# Altium schematic symbol library LATTICEPLDS_Library.SchLib: 291 symbols (part 12 of 32) (continued)
## LFE3-17EA/35EA-FN256 (continued)
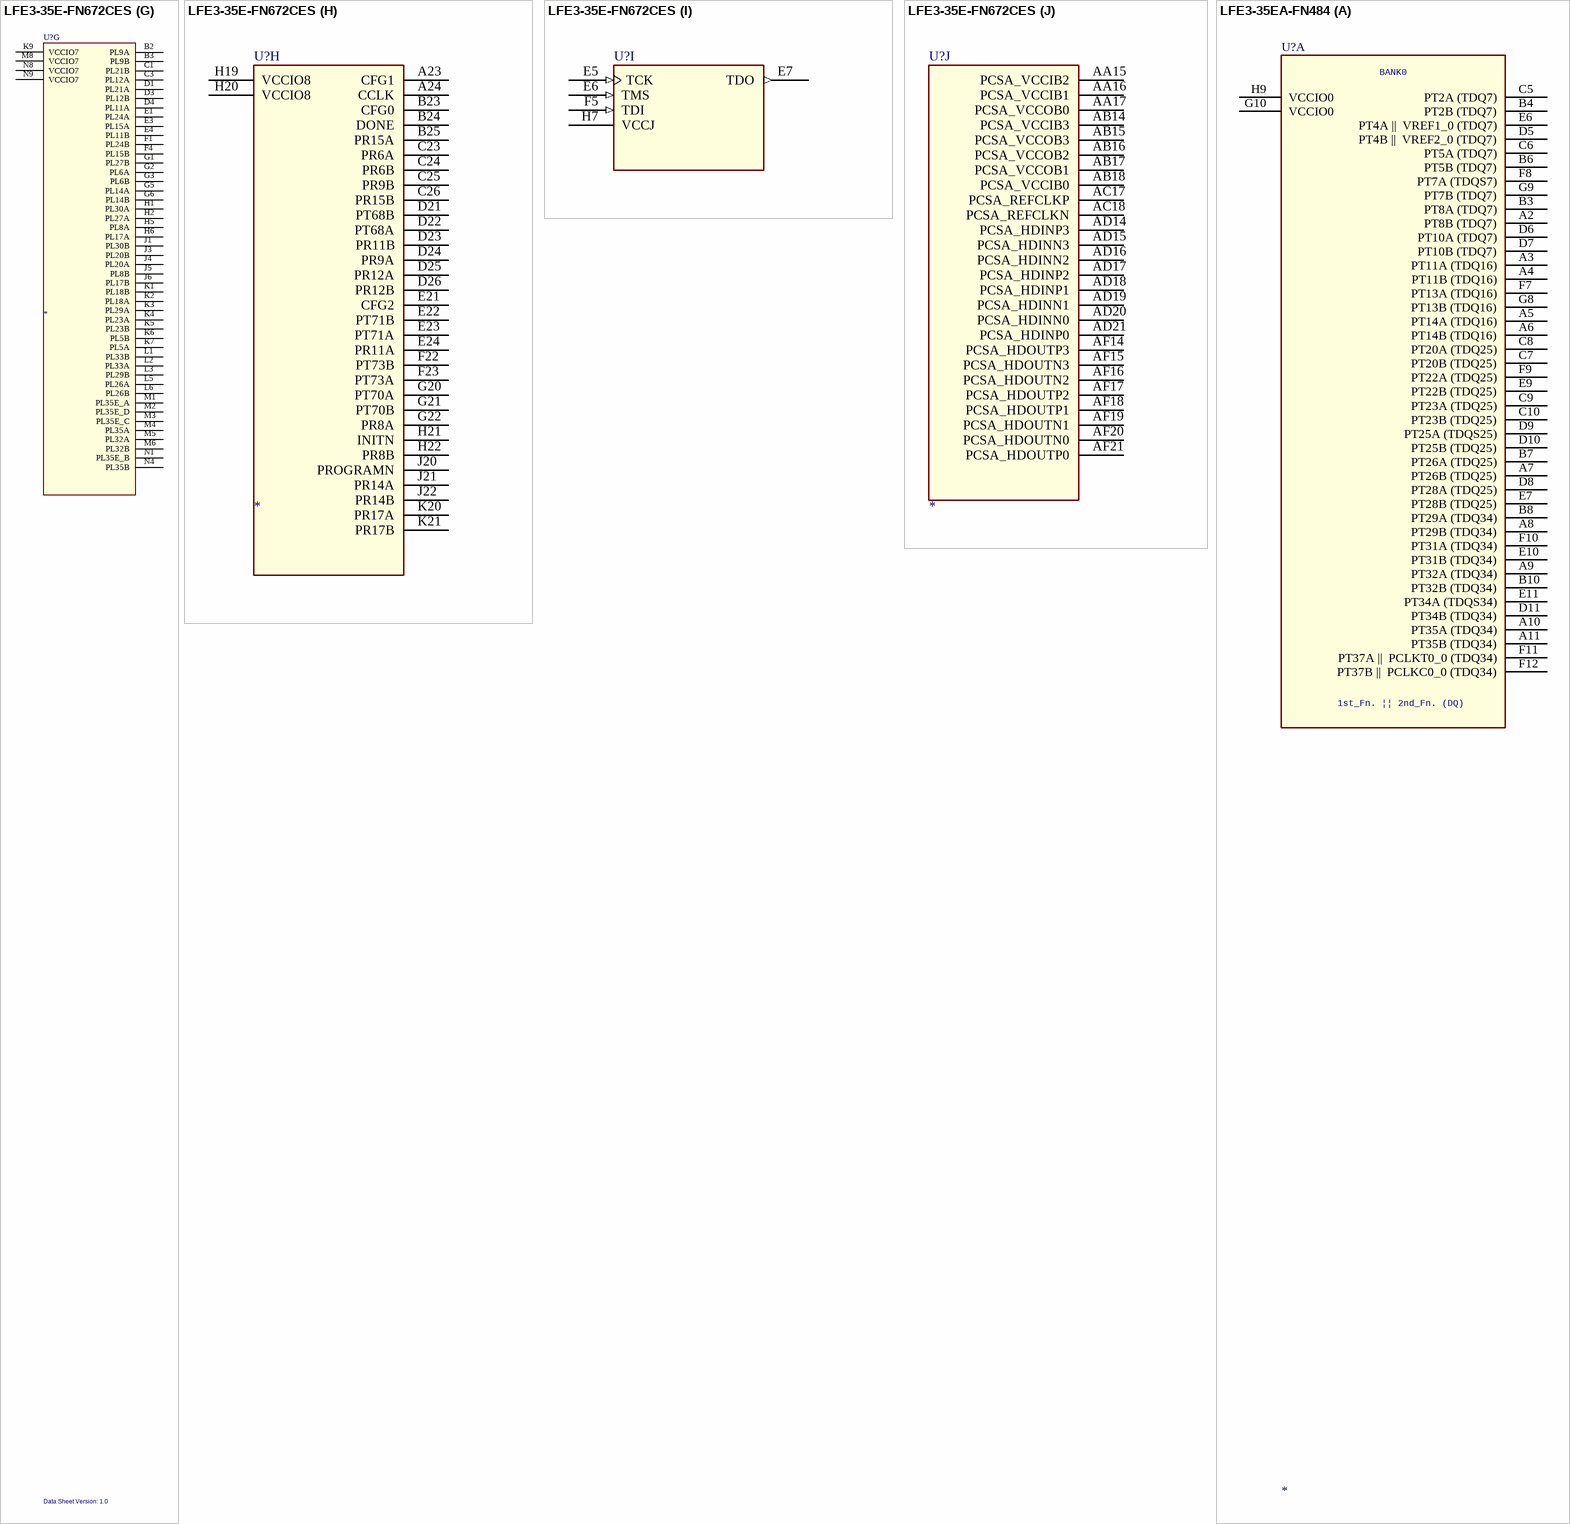
[diagram p129: symbols LFE3-35E-FN672CES to LFE3-35EA-FN484]
part A text: ^DQS; *True LVDS
part B text: ^DQS; *True LVDS
part E text: ^DQS; *True LVDS
part F text: ^DQS; *True LVDS
part H text: ^DQS; *True LVDS
part I text: ^DQS; *True LVDS

## LFE3-35E-FN672CES
designator U?  Data Sheet Version: 1.0
SPLIT_INST: TRUE; SWAP_INFO: (S1+S2+S3+S4+S5+S6+S7+S8+S9+S10)
part A pins: A2 GND (power), A8 NC, A25 GND (power), AA6 GND (power), AA8 GND (power), AA9 GND (power), AA10 NC, AA11 NC, AA12 NC, AA13 GND (power), AA14 GND (power), AA18 GND (power), AA19 GND (power), AA21 GND (power), AB2 GND (power), AB8 GND (power), AB9 NC, AB10 NC, AB11 NC, AB12 NC, AB13 NC, AB19 GND (power), AB25 GND (power), AC5 GND (power), AC6 GND (power), AC7 GND (power), AC8 GND (power), AC9 NC, AC10 NC, AC11 GND (power), AC12 GND (power), AC13 GND (power), AC14 GND (power), AC15 GND (power), AC16 GND (power), AC19 GND (power), AC20 GND (power), AC21 GND (power), AC22 GND (power), AD5 GND (power), AD6 NC, AD7 NC, AD8 NC, AD9 NC, AD10 NC, AD11 NC, AD12 NC, AD13 NC, AD22 GND (power), AE1 GND (power), AE5 GND (power), AE6 GND (power), AE7 GND (power), AE8 GND (power), AE9 GND (power), AE10 GND (power), AE11 GND (power), AE12 GND (power), AE13 GND (power), AE14 GND (power), AE15 GND (power), AE16 GND (power), AE17 GND (power), AE18 GND (power), AE19 GND (power), AE20 GND (power), AE21 GND (power), AE22 GND (power), AE26 GND (power), AF2 GND (power), AF5 GND (power), AF6 NC, AF7 NC, AF8 NC, AF9 NC, AF10 NC, AF11 NC, AF12 NC, AF13 NC, AF22 GND (power), AF25 GND (power), B1 GND (power), B5 GND (power), B8 NC, B9 GND (power), B14 GND (power), B18 GND (power), B22 GND (power), B26 GND (power), C2 NC, C9 NC, C10 NC, C18 NC, C19 NC, D2 NC, D7 GND (power), D9 NC, D10 NC, D11 GND (power), D16 GND (power), D18 NC, D19 NC, D20 GND (power), E2 GND (power), E10 NC, E17 NC, E25 GND (power), E26 NC, F2 NC, F3 NC, F6 GND (power), F10 NC, F16 NC, F17 NC, F18 NC, F21 GND (power), F24 NC, F25 NC, F26 NC, G4 GND (power), G9 NC, G10 NC, G12 GND (power), G15 GND (power), G16 NC, G17 NC, G23 GND (power), G24 NC, G26 NC, H3 NC, H4 NC, H9 GND (power), H10 NC, H11 NC, H16 NC, H17 NC, H18 GND (power), H23 NC, H25 NC, H26 NC, J2 GND (power), J7 NC, J8 GND (power), J9 VCCAUX, J11 VCCAUX, J12 GND (power), J15 GND (power), J16 VCCAUX, J18 VCCAUX, J19 GND (power), J23 NC, J25 GND (power), K8 NC, K10 GND (power), K11 VCC, K12 VCC, K13 VCC, K14 VCC, K15 VCC, K16 VCC, K17 GND (power), K22 NC, K23 NC, L4 GND (power), L7 NC, L8 NC, L9 VCCAUX, L10 VCC, L11 VCC, L12 VCC, L13 GND (power), L14 GND (power), L15 VCC, L16 VCC, L17 VCC, L18 VCCAUX, L21 NC, L22 NC, L23 GND (power), M7 GND (power), M9 GND (power), M10 VCCPLL_L, M11 VCC, M12 GND (power), M13 GND (power), M14 GND (power), M15 GND (power), M16 VCC, M17 VCCPLL_R, M18 GND (power), M20 GND (power), N2 GND (power), N7 VTT7 (power), N10 VCC, N11 GND (power), N12 GND (power), N13 GND (power), N14 GND (power), N15 GND (power), N16 GND (power), N17 VCC, N20 VTT2 (power), P7 VTT6 (power), P10 VCC, P11 GND (power), P12 GND (power), P13 GND (power), P14 GND (power), P15 GND (power), P16 GND (power), P17 VCC, P20 VTT3 (power), P25 GND (power), R7 GND (power), R9 GND (power), R10 VCCPLL_L, R11 VCC, R12 GND (power), R13 GND (power), R14 GND (power), R15 GND (power), R16 VCC, R17 VCCPLL_R, R18 XRES, R20 GND (power), T4 GND (power), T5 NC, T6 NC, T9 VCCAUX, T10 VCC, T11 VCC, T12 VCC, T13 GND (power), T14 GND (power), T15 VCC, T16 VCC, T17 VCC, T18 VCCAUX, T19 GND (power), T23 GND (power), U5 NC, U6 NC, U7 NC, U8 NC, U10 RESERVED, U11 VCC, U12 VCC, U13 VCC, U14 VCC, U15 VCC, U16 VCC, U17 GND (power), V2 GND (power), V3 NC, V4 NC, V8 RESERVED, V9 VCCAUX, V11 VCCAUX, V12 GND (power), V13 VCCA, V14 VCCA, V15 GND (power), V16 VCCAUX, V17 NC, V18 VCCAUX, V19 GND (power), V23 NC, V25 GND (power), W3 NC, W4 NC, W5 NC, W11 GND (power), W12 VCCA, W13 VCCA, W14 VCCA, W15 VCCA, W16 GND (power), W18 NC, W24 NC, W25 NC, W26 NC, Y1 NC, Y2 NC, Y3 NC, Y4 GND (power), Y9 GND (power), Y10 GND (power), Y11 GND (power), Y12 GND (power), Y13 VCCA, Y14 VCCA, Y15 GND (power), Y16 GND (power), Y17 GND (power), Y18 GND (power), Y23 GND (power), Y25 NC, Y26 NC
part B pins: A3 PT11A, A4 PT11B, A5 PT17A, A6 PT17B, A7 PT14B, A9 PT20A, A10 PT23A, A11 PT23B, A12 PT29A, A13 PT32A, A14 PT32B, A15 PT35A, A16 PT35B, B4 PT7B, B6 PT2A, B7 PT14A, B10 PT20B, B11 PT26A, B12 PT26B, B13 PT29B, C4 PT4B, C5 PT7A, C6 PT5B, C7 PT2B, C8 PT8B, C11 PT25B, C12 PT31A, C13 PT31B, D5 PT4A, D6 PT5A, D8 PT8A, D12 PT25A, D13 PT37B, E8 PT16A, E9 PT16B, E11 PT28A, E12 PT28B, E13 PT37A, F7 PT13A, F8 PT13B, F9 PT19B, F11 PT22A, F12 PT34A, G7 PT10A, G8 PT19A, G11 PT22B, G13 PT34B, H8 PT10B, H12 VCCIO0 (power), H13 VCCIO0 (power), J10 VCCIO0 (power), J13 VCCIO0 (power)
part C pins: A17 PT44A, A18 PT44B, A19 PT47A, A20 PT47B, A21 PT50A, A22 PT59B, B15 PT38B, B16 PT41A, B17 PT46A, B19 PT53B, B20 PT50B, B21 PT59A, C14 PT40A, C15 PT38A, C16 PT41B, C17 PT46B, C20 PT53A, C21 PT62B, C22 PT62A, D14 PT40B, D15 PT55A, D17 PT58B, E14 PT49A, E15 PT49B, E16 PT55B, E18 PT58A, E19 PT56A, E20 PT56B, F13 PT43A, F14 PT43B, F15 PT52B, F19 PT61A, F20 PT61B, G14 PT52A, G18 PT64A, G19 PT64B, H14 VCCIO1 (power), H15 VCCIO1 (power), J14 VCCIO1 (power), J17 VCCIO1 (power)
part D pins: G25 PR18B, H24 PR18A, J24 PR21B, J26 PR27A, K18 VCCIO2 (power), K19 PR30A, K24 PR21A, K25 PR24B, K26 PR27B, L19 PR30B, L20 PR20A, L24 PR24A, L25 PR33A, L26 PR33B, M19 VCCIO2 (power), M21 PR20B, M22 PR26A, M23 PR23A, M24 PR23B, M25 PR35E_A, M26 PR35E_B, N18 VCCIO2 (power), N19 VCCIO2 (power), N21 PR26B, N22 PR29B, N23 PR29A, P21 PR35A, P22 PR35B, P23 PR32A, R21 PR35E_D, R22 PR32B, T21 PR35E_C
part E pins: AA20 PB73B, AA22 PR68B, AA23 PR62B, AA24 PR62A, AA25 PR54A, AA26 PR57A, AB20 PB67A, AB21 PB67B, AB22 PB71B, AB23 PB71A, AB24 PR66A, AB26 PR57B, AC23 PB65B, AC24 PR66B, AC25 PR63B, AC26 PR63A, AD23 PB65A, AD24 PR71A, AD25 PR60B, AD26 PR60A, AE23 PB68B, AE24 PR71B, AE25 PR69A, AF23 PB68A, AF24 PR69B, N24 PR36A, N25 PR36B, N26 PR42A, P18 VCCIO3 (power), P19 VCCIO3 (power), P24 PR39A, P26 PR42B, R19 VCCIO3 (power), R23 PR41A, R24 PR39B, R25 PR45A, R26 PR45B, T20 PR44A, T22 PR41B, T24 PR48B, T25 PR48A, T26 PR51A, U18 VCCIO3 (power), U19 PR38B, U20 PR38A, U21 PR44B, U22 PR53B, U23 PR53A, U24 PR47A, U25 PR53E_A, U26 PR51B, V20 PR53E_C, V21 PR50A, V22 PR50B, V24 PR47B, V26 PR53E_B, W17 PB70A, W19 PR53E_D, W20 PR59B, W21 PR59A, W22 PR56B, W23 PR56A, Y19 PR65A, Y20 PR65B, Y21 PB73A, Y22 PR68A, Y24 PR54B
part F pins: AA1 PL54A, AA2 PL54B, AA3 PL63A, AA4 PL63B, AA5 PL62B, AA7 PB4A, AB1 PL57A, AB3 PL66A, AB4 PL66B, AB5 PL65A, AB6 PL65B, AB7 PB4B, AC1 PL57B, AC2 PL60A, AC3 PL60B, AC4 PB5B, AD1 PL69A, AD2 PL69B, AD3 PB5A, AD4 PB2A, AE2 PB8A, AE3 PB2B, AE4 PB11A, AF3 PB8B, AF4 PB11B, N3 PL41A, N5 PL38A, N6 PL38B, P1 PL36A, P2 PL36B, P3 PL41B, P4 PL45A, P5 PL44A, P6 PL44B, P8 VCCIO6 (power), P9 VCCIO6 (power), R1 PL39A, R2 PL39B, R3 PL45B, R4 PL50B, R5 PL47A, R6 PL47B, R8 VCCIO6 (power), T1 PL48A, T2 PL42A, T3 PL50A, T7 PL53A, T8 PL53B, U1 PL48B, U2 PL51B, U3 PL42B, U4 PL53E_C, U9 VCCIO6 (power), V1 PL51A, V5 PL53E_D, V6 PL56A, V7 PL56B, V10 PB13A, W1 PL53E_A, W2 PL53E_B, W6 PL59B, W7 PL59A, W8 PL71A, W9 PL71B, W10 PB13B, Y5 PL62A, Y6 PL68A, Y7 PL68B, Y8 PB10A
part G pins: B2 PL9A, B3 PL9B, C1 PL21B, C3 PL12A, D1 PL21A, D3 PL12B, D4 PL11A, E1 PL24A, E3 PL15A, E4 PL11B, F1 PL24B, F4 PL15B, G1 PL27B, G2 PL6A, G3 PL6B, G5 PL14A, G6 PL14B, H1 PL30A, H2 PL27A, H5 PL8A, H6 PL17A, J1 PL30B, J3 PL20B, J4 PL20A, J5 PL8B, J6 PL17B, K1 PL18B, K2 PL18A, K3 PL29A, K4 PL23A, K5 PL23B, K6 PL5B, K7 PL5A, K9 VCCIO7 (power), L1 PL33B, L2 PL33A, L3 PL29B, L5 PL26A, L6 PL26B, M1 PL35E_A, M2 PL35E_D, M3 PL35E_C, M4 PL35A, M5 PL32A, M6 PL32B, M8 VCCIO7 (power), N1 PL35E_B, N4 PL35B, N8 VCCIO7 (power), N9 VCCIO7 (power)
part H pins: A23 CFG1, A24 CCLK, B23 CFG0, B24 DONE, B25 PR15A, C23 PR6A, C24 PR6B, C25 PR9B, C26 PR15B, D21 PT68B, D22 PT68A, D23 PR11B, D24 PR9A, D25 PR12A, D26 PR12B, E21 CFG2, E22 PT71B, E23 PT71A, E24 PR11A, F22 PT73B, F23 PT73A, G20 PT70A, G21 PT70B, G22 PR8A, H19 VCCIO8 (power), H20 VCCIO8 (power), H21 INITN, H22 PR8B, J20 PROGRAMN, J21 PR14A, J22 PR14B, K20 PR17A, K21 PR17B
part I pins: E5 TCK (in), E6 TMS (in), E7 TDO (out), F5 TDI (in), H7 VCCJ (power)
part J pins: AA15 PCSA_VCCIB2, AA16 PCSA_VCCIB1, AA17 PCSA_VCCOB0, AB14 PCSA_VCCIB3, AB15 PCSA_VCCOB3, AB16 PCSA_VCCOB2, AB17 PCSA_VCCOB1, AB18 PCSA_VCCIB0, AC17 PCSA_REFCLKP, AC18 PCSA_REFCLKN, AD14 PCSA_HDINP3, AD15 PCSA_HDINN3, AD16 PCSA_HDINN2, AD17 PCSA_HDINP2, AD18 PCSA_HDINP1, AD19 PCSA_HDINN1, AD20 PCSA_HDINN0, AD21 PCSA_HDINP0, AF14 PCSA_HDOUTP3, AF15 PCSA_HDOUTN3, AF16 PCSA_HDOUTN2, AF17 PCSA_HDOUTP2, AF18 PCSA_HDOUTP1, AF19 PCSA_HDOUTN1, AF20 PCSA_HDOUTN0, AF21 PCSA_HDOUTP0

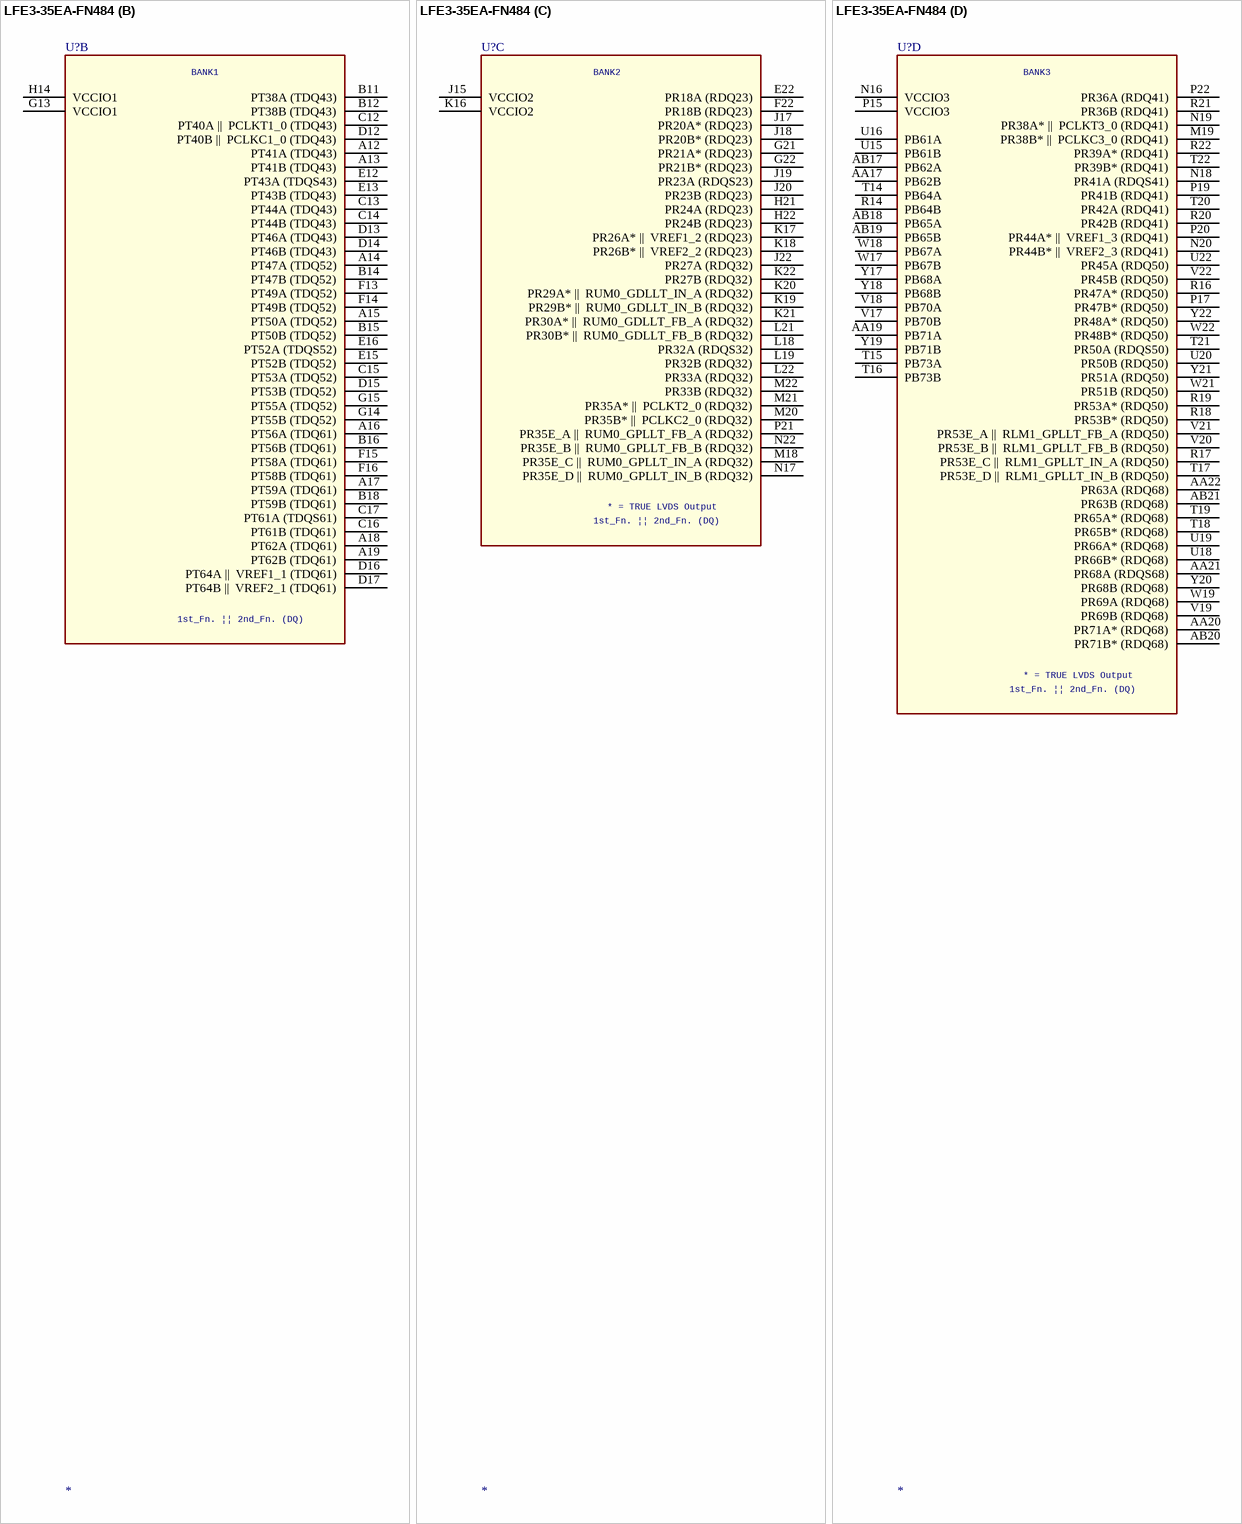
[diagram p130: symbol LFE3-35EA-FN484]

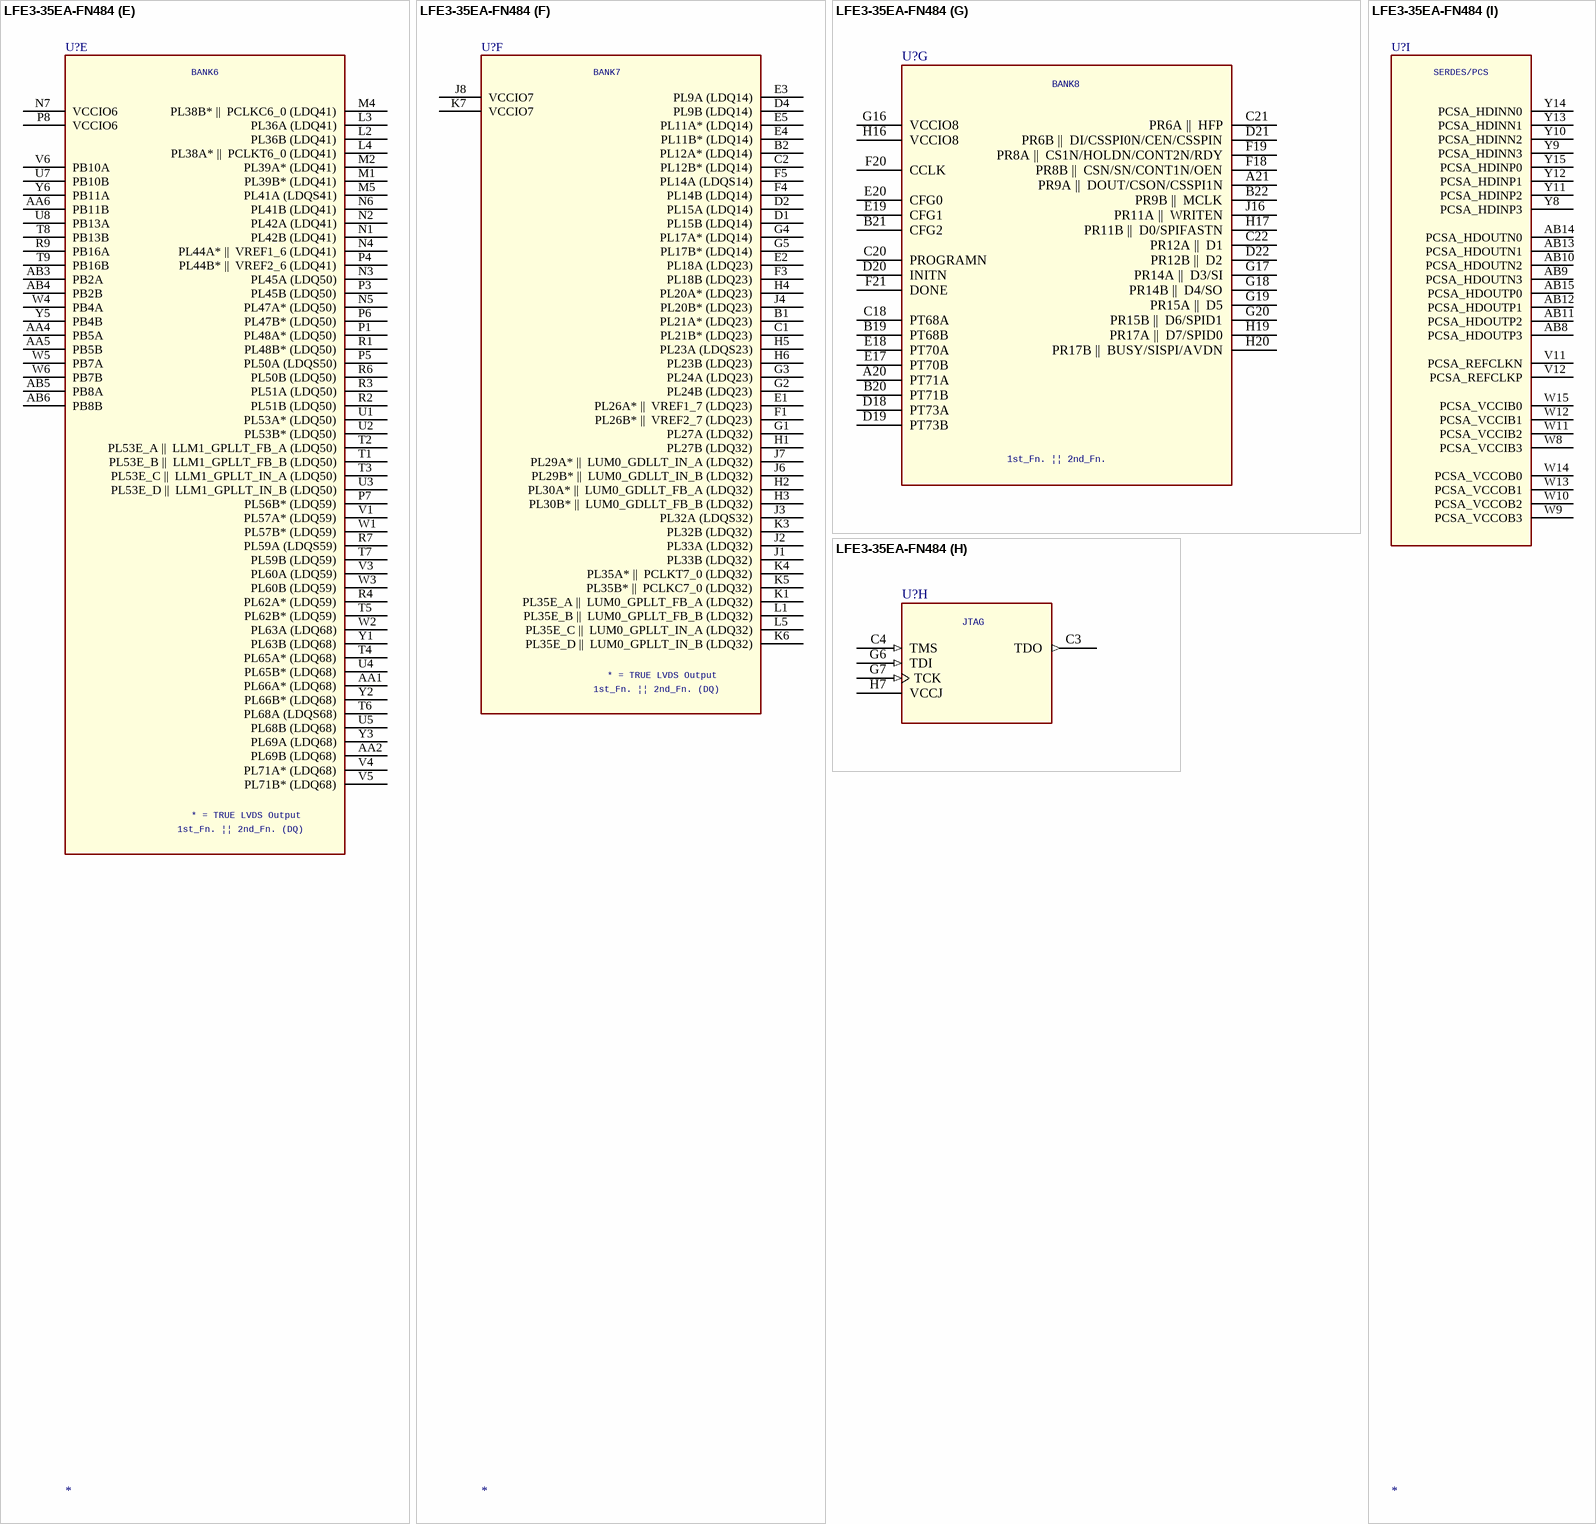
[diagram p131: symbol LFE3-35EA-FN484]

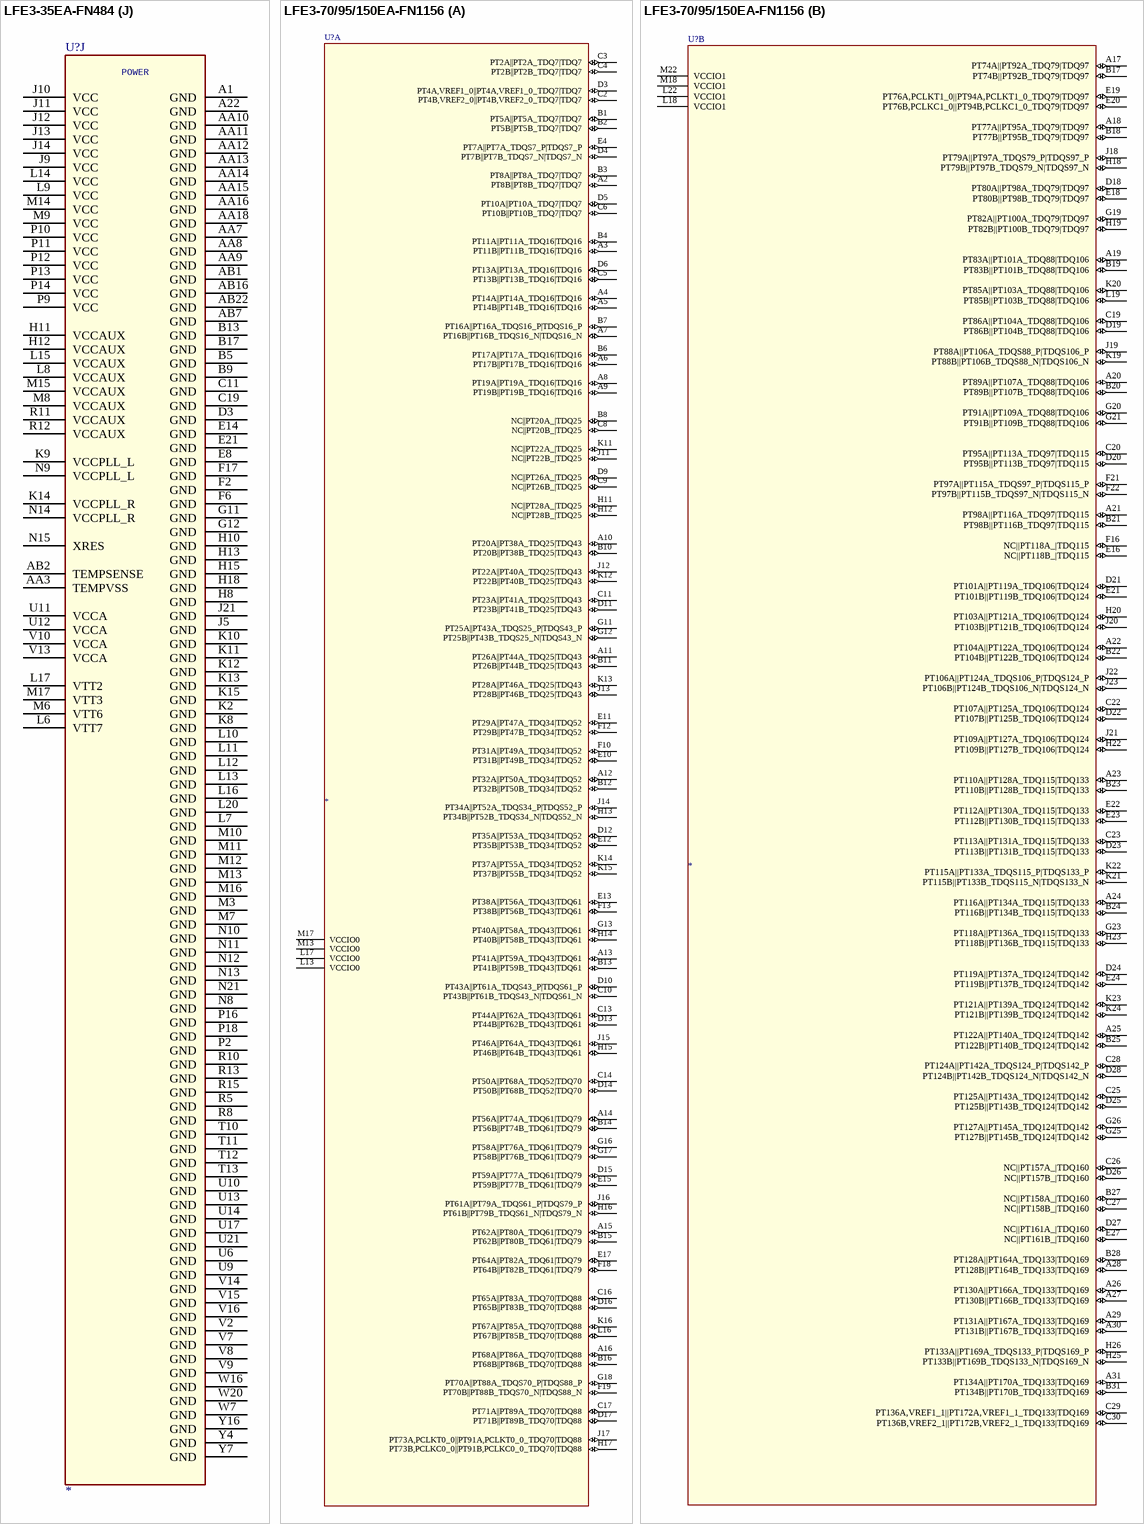
[diagram p132: symbols LFE3-35EA-FN484 to LFE3-70/95/150EA-FN1156]